# Altium footprint library Generic Footprint.PcbLib: 160 footprints (part 14 of 20) (continued)
## Symbol_FCC-Logo-1.5x1mm_silkscreen [mm] (continued)
1(0.534,0.466) 1(0.534,0.467) 1(0.534,0.469) 1(0.534,0.471) 1(0.534,0.605) 1(0.534,0.61) 1(0.534,0.612) 1(0.534,0.614) 1(0.534,0.615) 1(0.534,0.617) 1(0.534,0.619) 1(0.535,0.447) 1(0.535,0.449) 1(0.535,0.45) 1(0.535,0.452) 1(0.535,0.454) 1(0.535,0.455) 1(0.535,0.459) 1(0.535,0.461) 1(0.535,0.462) 1(0.535,0.464) 1(0.535,0.466) 1(0.535,0.467) 1(0.535,0.469) 1(0.535,0.605) 1(0.535,0.607) 1(0.535,0.61) 1(0.535,0.612) 1(0.535,0.614) 1(0.535,0.615) 1(0.535,0.617) 1(0.535,0.619) 1(0.535,0.622) 1(0.535,0.624) 1(0.535,0.626) 1(0.535,0.627) 1(0.535,0.629) 1(0.537,0.439) 1(0.537,0.44) 1(0.537,0.442) 1(0.537,0.444) 1(0.537,0.447) 1(0.537,0.449) 1(0.537,0.45) 1(0.537,0.452) 1(0.537,0.454) 1(0.537,0.455) 1(0.537,0.457) 1(0.537,0.459) 1(0.537,0.461) 1(0.537,0.462) 1(0.537,0.464) 1(0.537,0.466) 1(0.537,0.467) 1(0.537,0.469) 1(0.537,0.609) 1(0.537,0.61) 1(0.537,0.612) 1(0.537,0.614) 1(0.537,0.615) 1(0.537,0.617) 1(0.537,0.619) 1(0.537,0.62) 1(0.537,0.622) 1(0.537,0.624) 1(0.537,0.626) 1(0.537,0.627) 1(0.537,0.629) 1(0.537,0.632) 1(0.537,0.634) 1(0.537,0.636) 1(0.537,0.637) 1(0.537,0.639) 1(0.539,0.432) 1(0.539,0.435) 1(0.539,0.455) 1(0.539,0.622) 1(0.539,0.639) 1(0.539,0.641) 1(0.539,0.648) 1(0.541,0.422) 1(0.541,0.423) 1(0.541,0.425) 1(0.541,0.427) 1(0.541,0.428) 1(0.541,0.43) 1(0.541,0.433) 1(0.541,0.439) 1(0.541,0.44) 1(0.541,0.442) 1(0.541,0.444) 1(0.541,0.445) 1(0.541,0.447) 1(0.541,0.449) 1(0.541,0.45) 1(0.541,0.452) 1(0.541,0.454) 1(0.541,0.624) 1(0.541,0.626) 1(0.541,0.627) 1(0.541,0.629) 1(0.541,0.631) 1(0.541,0.632) 1(0.541,0.634) 1(0.541,0.636) 1(0.541,0.637) 1(0.541,0.641) 1(0.541,0.643) 1(0.541,0.644) 1(0.541,0.646) 1(0.541,0.649) 1(0.541,0.651) 1(0.541,0.653) 1(0.541,0.654) 1(0.541,0.656) 1(0.542,0.415) 1(0.542,0.416) 1(0.542,0.418) 1(0.542,0.42) 1(0.542,0.43) 1(0.542,0.432) 1(0.542,0.433) 1(0.542,0.435) 1(0.542,0.437) 1(0.542,0.439) 1(0.542,0.44) 1(0.542,0.442) 1(0.542,0.444) 1(0.542,0.632) 1(0.542,0.634) 1(0.542,0.636) 1(0.542,0.637) 1(0.542,0.639) 1(0.542,0.641) 1(0.542,0.643) 1(0.542,0.644) 1(0.542,0.646) 1(0.542,0.648) 1(0.542,0.649) 1(0.542,0.658) 1(0.542,0.659) 1(0.542,0.661) 1(0.542,0.663) 1(0.544,0.406) 1(0.544,0.408) 1(0.544,0.41) 1(0.544,0.411) 1(0.544,0.413) 1(0.544,0.422) 1(0.544,0.427) 1(0.544,0.43) 1(0.544,0.432) 1(0.544,0.433) 1(0.544,0.435) 1(0.544,0.643) 1(0.544,0.644) 1(0.544,0.646) 1(0.544,0.648) 1(0.544,0.649) 1(0.544,0.653) 1(0.544,0.654) 1(0.544,0.656) 1(0.544,0.665) 1(0.544,0.666) 1(0.544,0.668) 1(0.544,0.67) 1(0.544,0.671) 1(0.546,0.422) 1(0.546,0.427) 1(0.546,0.653) 1(0.546,0.654) 1(0.546,0.656) 1(0.547,0.401) 1(0.547,0.403) 1(0.547,0.405) 1(0.547,0.673) 1(0.547,0.675) 1(0.547,0.677) 1(0.549,0.393) 1(0.549,0.394) 1(0.549,0.396) 1(0.549,0.398) 1(0.549,0.401) 1(0.549,0.403) 1(0.549,0.675) 1(0.549,0.677) 1(0.549,0.68) 1(0.549,0.682) 1(0.549,0.683) 1(0.549,0.685) 1(0.551,0.388) 1(0.551,0.389) 1(0.551,0.393) 1(0.551,0.394) 1(0.551,0.396) 1(0.551,0.398) 1(0.551,0.399) 1(0.551,0.401) 1(0.551,0.403) 1(0.551,0.675) 1(0.551,0.677) 1(0.551,0.68) 1(0.551,0.682) 1(0.551,0.683) 1(0.551,0.685) 1(0.551,0.688) 1(0.552,0.382) 1(0.552,0.384) 1(0.552,0.388) 1(0.552,0.389) 1(0.552,0.393) 1(0.552,0.394) 1(0.552,0.396) 1(0.552,0.398) 1(0.552,0.678) 1(0.552,0.68) 1(0.552,0.682) 1(0.552,0.683) 1(0.552,0.685) 1(0.552,0.688) 1(0.552,0.692) 1(0.552,0.694) 1(0.552,0.695) 1(0.554,0.376) 1(0.554,0.377) 1(0.554,0.379) 1(0.554,0.382) 1(0.554,0.384) 1(0.554,0.388) 1(0.554,0.389) 1(0.554,0.391) 1(0.554,0.687) 1(0.554,0.688) 1(0.554,0.69) 1(0.554,0.692) 1(0.554,0.694) 1(0.554,0.695) 1(0.554,0.699) 1(0.554,0.7) 1(0.556,0.372) 1(0.556,0.374) 1(0.556,0.386) 1(0.556,0.692) 1(0.556,0.697) 1(0.556,0.7) 1(0.556,0.702) 1(0.556,0.704) 1(0.556,0.705) 1(0.558,0.365) 1(0.558,0.367) 1(0.558,0.369) 1(0.558,0.371) 1(0.558,0.376) 1(0.558,0.377) 1(0.558,0.381) 1(0.558,0.382) 1(0.558,0.384) 1(0.558,0.694) 1(0.558,0.695) 1(0.558,0.699) 1(0.558,0.707) 1(0.558,0.709) 1(0.558,0.711) 1(0.558,0.712) 1(0.558,1.078) 1(0.559,0.359) 1(0.559,0.36) 1(0.559,0.362) 1(0.559,0.364) 1(0.559,0.371) 1(0.559,0.372) 1(0.559,0.376) 1(0.559,0.377) 1(0.559,0.699) 1(0.559,0.7) 1(0.559,0.704) 1(0.559,0.705) 1(0.559,0.707) 1(0.559,0.714) 1(0.559,0.716) 1(0.559,0.717) 1(0.559,1.074) 1(0.559,1.076) 1(0.559,1.078) 1(0.561,0.357) 1(0.561,0.359) 1(0.561,0.36) 1(0.561,0.371) 1(0.561,0.372) 1(0.561,0.704) 1(0.561,0.705) 1(0.561,0.707) 1(0.561,0.717) 1(0.561,0.719) 1(0.561,0.721) 1(0.561,0.906) 1(0.561,0.908) 1(0.561,0.909) 1(0.561,0.911) 1(0.561,0.913) 1(0.561,0.915) 1(0.561,0.916) 1(0.561,0.918) 1(0.561,0.92) 1(0.561,0.921) 1(0.561,0.923) 1(0.561,0.925) 1(0.561,0.926) 1(0.561,0.928) 1(0.561,0.93) 1(0.561,0.932) 1(0.561,0.933) 1(0.561,0.935) 1(0.561,0.937) 1(0.561,0.938) 1(0.561,0.94) 1(0.561,0.942) 1(0.561,0.943) 1(0.561,0.945) 1(0.561,0.947) 1(0.561,0.948) 1(0.561,0.95) 1(0.561,0.952) 1(0.561,0.954) 1(0.561,0.955) 1(0.561,0.957) 1(0.561,0.959) 1(0.561,0.96) 1(0.561,0.962) 1(0.561,0.964) 1(0.561,0.966) 1(0.561,0.967) 1(0.561,0.969) 1(0.561,0.971) 1(0.561,0.972) 1(0.561,0.974) 1(0.561,0.976) 1(0.561,0.977) 1(0.561,0.979) 1(0.561,0.981) 1(0.561,0.983) 1(0.561,0.984) 1(0.561,0.986) 1(0.561,0.988) 1(0.561,0.989) 1(0.561,0.991) 1(0.561,0.993) 1(0.561,0.994) 1(0.561,0.996) 1(0.561,0.998) 1(0.561,1) 1(0.561,1.001) 1(0.561,1.003) 1(0.561,1.005) 1(0.561,1.006) 1(0.561,1.008) 1(0.561,1.01) 1(0.561,1.011) 1(0.561,1.013) 1(0.561,1.015) 1(0.561,1.017) 1(0.561,1.018) 1(0.561,1.02) 1(0.561,1.022) 1(0.561,1.023) 1(0.561,1.025) 1(0.561,1.027) 1(0.561,1.028) 1(0.561,1.03) 1(0.561,1.032) 1(0.561,1.034) 1(0.561,1.035) 1(0.561,1.037) 1(0.561,1.039) 1(0.561,1.04) 1(0.561,1.042) 1(0.561,1.044) 1(0.561,1.045) 1(0.561,1.047) 1(0.561,1.049) 1(0.561,1.051) 1(0.561,1.052) 1(0.561,1.054) 1(0.561,1.056) 1(0.561,1.057) 1(0.561,1.059) 1(0.561,1.061) 1(0.561,1.062) 1(0.561,1.064) 1(0.561,1.066) 1(0.561,1.067) 1(0.561,1.069) 1(0.561,1.071) 1(0.561,1.073) 1(0.561,1.074) 1(0.561,1.076) 1(0.561,1.078) 1(0.561,1.079) 1(0.563,0.357) 1(0.563,0.359) 1(0.563,0.36) 1(0.563,0.717) 1(0.563,0.721) 1(0.563,0.726) 1(0.563,0.906) 1(0.563,0.908) 1(0.563,0.909) 1(0.563,0.911) 1(0.563,0.913) 1(0.563,0.915) 1(0.563,0.916) 1(0.563,0.918) 1(0.563,0.92) 1(0.563,0.921) 1(0.563,0.923) 1(0.563,0.925) 1(0.563,0.926) 1(0.563,0.928) 1(0.563,0.93) 1(0.563,0.932) 1(0.563,0.933) 1(0.563,0.935) 1(0.563,0.937) 1(0.563,0.938) 1(0.563,0.94) 1(0.563,0.942) 1(0.563,0.943) 1(0.563,0.945) 1(0.563,0.947) 1(0.563,0.948) 1(0.563,0.95) 1(0.563,0.952) 1(0.563,0.954) 1(0.563,0.955) 1(0.563,0.957) 1(0.563,0.959) 1(0.563,0.96) 1(0.563,0.962) 1(0.563,0.964) 1(0.563,0.966) 1(0.563,0.967) 1(0.563,0.969) 1(0.563,0.971) 1(0.563,0.972) 1(0.563,0.974) 1(0.563,0.976) 1(0.563,0.977) 1(0.563,0.979) 1(0.563,0.981) 1(0.563,0.983) 1(0.563,0.984) 1(0.563,0.986) 1(0.563,0.988) 1(0.563,0.989) 1(0.563,0.991) 1(0.563,0.993) 1(0.563,0.994) 1(0.563,0.996) 1(0.563,0.998) 1(0.563,1) 1(0.563,1.001) 1(0.563,1.003) 1(0.563,1.005) 1(0.563,1.006) 1(0.563,1.008) 1(0.563,1.01) 1(0.563,1.011) 1(0.563,1.013) 1(0.563,1.015) 1(0.563,1.017) 1(0.563,1.018) 1(0.563,1.02) 1(0.563,1.022) 1(0.563,1.023) 1(0.563,1.025) 1(0.563,1.027) 1(0.563,1.028) 1(0.563,1.03) 1(0.563,1.032) 1(0.563,1.034) 1(0.563,1.035) 1(0.563,1.037) 1(0.563,1.039) 1(0.563,1.04) 1(0.563,1.042) 1(0.563,1.044) 1(0.563,1.045) 1(0.563,1.047) 1(0.563,1.049) 1(0.563,1.051) 1(0.563,1.052) 1(0.563,1.054) 1(0.563,1.056) 1(0.563,1.057) 1(0.563,1.059) 1(0.563,1.061) 1(0.563,1.062) 1(0.563,1.064) 1(0.563,1.066) 1(0.563,1.067) 1(0.563,1.069) 1(0.563,1.071) 1(0.563,1.074) 1(0.563,1.076) 1(0.564,0.35) 1(0.564,0.352) 1(0.564,0.354) 1(0.564,0.724) 1(0.564,0.728) 1(0.564,0.906) 1(0.564,0.908) 1(0.564,0.909) 1(0.564,0.911) 1(0.564,0.913) 1(0.564,0.915) 1(0.564,0.916) 1(0.564,0.918) 1(0.564,0.92) 1(0.564,0.921) 1(0.564,0.923) 1(0.564,0.925) 1(0.564,0.926) 1(0.564,0.928) 1(0.564,0.93) 1(0.564,0.932) 1(0.564,0.933) 1(0.564,0.935) 1(0.564,0.937) 1(0.564,0.938) 1(0.564,0.94) 1(0.564,0.942) 1(0.564,0.943) 1(0.564,0.945) 1(0.564,0.947) 1(0.564,0.948) 1(0.564,0.95) 1(0.564,0.952) 1(0.564,0.954) 1(0.564,0.955) 1(0.564,0.957) 1(0.564,0.959) 1(0.564,0.96) 1(0.564,0.962) 1(0.564,0.964) 1(0.564,0.966) 1(0.564,0.967) 1(0.564,0.969) 1(0.564,0.971) 1(0.564,0.972) 1(0.564,0.974) 1(0.564,0.976) 1(0.564,0.977) 1(0.564,0.979) 1(0.564,0.981) 1(0.564,0.983) 1(0.564,0.984) 1(0.564,0.986) 1(0.564,0.988) 1(0.564,0.989) 1(0.564,0.991) 1(0.564,0.993) 1(0.564,0.994) 1(0.564,0.996) 1(0.564,0.998) 1(0.564,1) 1(0.564,1.001) 1(0.564,1.003) 1(0.564,1.005) 1(0.564,1.006) 1(0.564,1.008) 1(0.564,1.01) 1(0.564,1.011) 1(0.564,1.013) 1(0.564,1.015) 1(0.564,1.017) 1(0.564,1.018) 1(0.564,1.02) 1(0.564,1.022) 1(0.564,1.023) 1(0.564,1.025) 1(0.564,1.027) 1(0.564,1.028) 1(0.564,1.03) 1(0.564,1.032) 1(0.564,1.034) 1(0.564,1.035) 1(0.564,1.037) 1(0.564,1.039) 1(0.564,1.04) 1(0.564,1.042) 1(0.564,1.044) 1(0.564,1.045) 1(0.564,1.047) 1(0.564,1.049) 1(0.564,1.051) 1(0.564,1.052) 1(0.564,1.054) 1(0.564,1.056) 1(0.564,1.057) 1(0.564,1.059) 1(0.564,1.061) 1(0.564,1.062) 1(0.564,1.064) 1(0.564,1.066) 1(0.564,1.067) 1(0.564,1.069) 1(0.566,0.347) 1(0.566,0.35) 1(0.566,0.352) 1(0.566,0.354) 1(0.566,0.355) 1(0.566,0.357) 1(0.566,0.721) 1(0.566,0.722) 1(0.566,0.724) 1(0.566,0.726) 1(0.566,0.728) 1(0.566,0.731) 1(0.566,0.903) 1(0.566,0.904) 1(0.566,1.071) 1(0.568,0.338) 1(0.568,0.342) 1(0.568,0.343) 1(0.568,0.347) 1(0.568,0.35) 1(0.568,0.352) 1(0.568,0.354) 1(0.568,0.724) 1(0.568,0.726) 1(0.568,0.728) 1(0.568,0.731) 1(0.568,0.734) 1(0.568,0.736) 1(0.568,0.903) 1(0.569,0.335) 1(0.569,0.342) 1(0.569,0.343) 1(0.569,0.347) 1(0.569,0.348) 1(0.569,0.729) 1(0.569,0.731) 1(0.569,0.734) 1(0.569,0.736) 1(0.569,0.739) 1(0.569,0.744) 1(0.569,0.901) 1(0.571,0.333) 1(0.571,0.338) 1(0.571,0.34) 1(0.571,0.342) 1(0.571,0.343) 1(0.571,0.345) 1(0.571,0.733) 1(0.571,0.734) 1(0.571,0.736) 1(0.571,0.738) 1(0.571,0.739) 1(0.571,0.743) 1(0.571,0.748) 1(0.573,0.328) 1(0.573,0.33) 1(0.573,0.331) 1(0.573,0.746) 1(0.574,0.325) 1(0.574,0.326) 1(0.574,0.336) 1(0.574,0.338) 1(0.574,0.739) 1(0.574,0.741) 1(0.574,0.75) 1(0.574,0.751) 1(0.574,0.753) 1(0.576,0.321) 1(0.576,0.323) 1(0.576,0.325) 1(0.576,0.753) 1(0.576,0.755) 1(0.576,0.756) 1(0.578,0.316) 1(0.578,0.318) 1(0.578,0.321) 1(0.578,0.323) 1(0.578,0.325) 1(0.578,0.753) 1(0.578,0.755) 1(0.578,0.756) 1(0.578,0.76) 1(0.58,0.314) 1(0.58,0.316) 1(0.58,0.318) 1(0.58,0.32) 1(0.58,0.321) 1(0.58,0.323) 1(0.58,0.755) 1(0.58,0.756) 1(0.58,0.76) 1(0.58,0.763) 1(0.581,0.758) 1(0.583,0.306) 1(0.583,0.309) 1(0.583,0.314) 1(0.583,0.316) 1(0.583,0.318) 1(0.583,0.76) 1(0.583,0.762) 1(0.583,0.763) 1(0.583,0.767) 1(0.583,0.768) 1(0.585,0.303) 1(0.585,0.304) 1(0.585,0.309) 1(0.585,0.313) 1(0.585,0.314) 1(0.585,0.763) 1(0.585,0.765) 1(0.585,0.767) 1(0.585,0.768) 1(0.585,0.772) 1(0.585,0.773) 1(0.586,0.299) 1(0.586,0.301) 1(0.586,0.304) 1(0.586,0.306) 1(0.586,0.309) 1(0.586,0.311) 1(0.586,0.767) 1(0.586,0.768) 1(0.586,0.772) 1(0.586,0.773) 1(0.586,0.775) 1(0.586,0.777) 1(0.586,0.779) 1(0.588,0.296) 1(0.588,0.304) 1(0.588,0.306) 1(0.588,0.308) 1(0.588,0.77) 1(0.588,0.772) 1(0.588,0.773) 1(0.588,0.782) 1(0.59,0.297) 1(0.59,0.78) 1(0.592,0.291) 1(0.592,0.292) 1(0.592,0.294) 1(0.592,0.784) 1(0.592,0.785) 1(0.592,0.787) 1(0.593,0.289) 1(0.593,0.291) 1(0.593,0.292) 1(0.593,0.784) 1(0.593,0.785) 1(0.593,0.789) 1(0.595,0.286) 1(0.595,0.289) 1(0.595,0.291) 1(0.595,0.292) 1(0.595,0.784) 1(0.595,0.785) 1(0.595,0.789) 1(0.597,0.282) 1(0.597,0.286) 1(0.597,0.289) 1(0.597,0.789) 1(0.597,0.796) 1(0.598,0.277) 1(0.598,0.279) 1(0.598,0.284) 1(0.598,0.794) 1(0.598,0.797) 1(0.598,0.799) 1(0.6,0.28) 1(0.6,0.282) 1(0.6,0.286) 1(0.6,0.287) 1(0.6,0.79) 1(0.6,0.792) 1(0.6,0.796) 1(0.6,0.801) 1(0.602,0.272) 1(0.602,0.274) 1(0.602,0.275) 1(0.602,0.277) 1(0.602,0.279) 1(0.602,0.282) 1(0.602,0.796) 1(0.602,0.797) 1(0.602,0.799) 1(0.602,0.801) 1(0.602,0.802) 1(0.602,0.804) 1(0.603,0.27) 1(0.603,0.277) 1(0.603,0.279) 1(0.603,0.797) 1(0.603,0.799) 1(0.603,0.801) 1(0.603,0.806) 1(0.603,0.807) 1(0.605,0.269) 1(0.605,0.27) 1(0.605,0.807) 1(0.605,0.809) 1(0.607,0.27) 1(0.608,0.262) 1(0.608,0.263) 1(0.608,0.265) 1(0.608,0.269) 1(0.608,0.807) 1(0.608,0.813) 1(0.608,0.814) 1(0.61,0.262) 1(0.61,0.263) 1(0.61,0.265) 1(0.61,0.267) 1(0.61,0.269) 1(0.61,0.811) 1(0.61,0.813) 1(0.61,0.814) 1(0.61,0.816) 1(0.612,0.257) 1(0.612,0.258) 1(0.612,0.263) 1(0.612,0.265) 1(0.612,0.813) 1(0.612,0.814) 1(0.612,0.816) 1(0.612,0.819) 1(0.612,0.821) 1(0.614,0.258) 1(0.614,0.26) 1(0.614,0.262) 1(0.614,0.816) 1(0.614,0.819) 1(0.615,0.251) 1(0.615,0.253) 1(0.615,0.255) 1(0.615,0.258) 1(0.615,0.818) 1(0.615,0.821) 1(0.615,0.823) 1(0.615,0.824) 1(0.615,0.826) 1(0.617,0.253) 1(0.617,0.819) 1(0.617,0.821) 1(0.617,0.824) 1(0.619,0.246) 1(0.619,0.248) 1(0.619,0.25) 1(0.619,0.253) 1(0.619,0.824) 1(0.619,0.828) 1(0.619,0.83) 1(0.619,0.831) 1(0.62,0.245) 1(0.62,0.83) 1(0.62,0.833) 1(0.622,0.243) 1(0.622,0.83) 1(0.622,0.833) 1(0.624,0.833) 1(0.624,0.835) 1(0.624,0.836) 1(0.624,0.838) 1(0.626,0.238) 1(0.626,0.24) 1(0.626,0.835) 1(0.626,0.836) 1(0.626,0.84) 1(0.627,0.235) 1(0.627,0.238) 1(0.627,0.24) 1(0.627,0.835) 1(0.627,0.836) 1(0.627,0.838) 1(0.629,0.231) 1(0.629,0.233) 1(0.629,0.24) 1(0.629,0.241) 1(0.629,0.838) 1(0.629,0.84) 1(0.629,0.843) 1(0.629,0.845) 1(0.631,0.229) 1(0.631,0.233) 1(0.631,0.235) 1(0.631,0.236) 1(0.631,0.238) 1(0.631,0.84) 1(0.631,0.841) 1(0.631,0.843) 1(0.631,0.847) 1(0.632,0.235) 1(0.632,0.843) 1(0.632,0.845) 1(0.632,0.848) 1(0.634,0.226) 1(0.634,0.228) 1(0.634,0.233) 1(0.634,0.845) 1(0.634,0.85) 1(0.634,0.852) 1(0.636,0.224) 1(0.636,0.226) 1(0.636,0.228) 1(0.636,0.85) 1(0.636,0.853) 1(0.637,0.223) 1(0.637,0.224) 1(0.637,0.228) 1(0.637,0.85) 1(0.637,0.852) 1(0.637,0.853) 1(0.637,0.855) 1(0.639,0.221) 1(0.639,0.223) 1(0.639,0.226) 1(0.639,0.852) 1(0.639,0.853) 1(0.639,0.855) 1(0.639,0.857) 1(0.641,0.218) 1(0.641,0.221) 1(0.641,0.224) 1(0.641,0.86) 1(0.642,0.214) 1(0.642,0.216) 1(0.642,0.223) 1(0.642,0.855) 1(0.642,0.857) 1(0.642,0.862) 1(0.644,0.212) 1(0.644,0.216) 1(0.644,0.218) 1(0.644,0.219) 1(0.644,0.221) 1(0.644,0.857) 1(0.644,0.86) 1(0.644,0.862) 1(0.644,0.863) 1(0.646,0.211) 1(0.646,0.214) 1(0.646,0.216) 1(0.646,0.218) 1(0.646,0.858) 1(0.646,0.86) 1(0.646,0.863) 1(0.646,0.865) 1(0.648,0.212) 1(0.648,0.214) 1(0.648,0.862) 1(0.648,0.863) 1(0.648,0.869) 1(0.649,0.867) 1(0.649,0.87) 1(0.651,0.206) 1(0.651,0.207) 1(0.651,0.209) 1(0.651,0.212) 1(0.651,0.872) 1(0.653,0.204) 1(0.653,0.206) 1(0.653,0.207) 1(0.653,0.872) 1(0.653,0.874) 1(0.654,0.202) 1(0.654,0.204) 1(0.654,0.206) 1(0.654,0.207) 1(0.654,0.872) 1(0.654,0.874) 1(0.654,0.875) 1(0.656,0.201) 1(0.656,0.202) 1(0.656,0.204) 1(0.656,0.874) 1(0.656,0.875) 1(0.656,0.877) 1(0.658,0.197) 1(0.658,0.199) 1(0.658,0.201) 1(0.658,0.877) 1(0.658,0.879) 1(0.66,0.195) 1(0.66,0.201) 1(0.66,0.202) 1(0.66,0.524) 1(0.66,0.525) 1(0.66,0.527) 1(0.66,0.529) 1(0.66,0.53) 1(0.66,0.532) 1(0.66,0.534) 1(0.66,0.535) 1(0.66,0.537) 1(0.66,0.539) 1(0.66,0.54) 1(0.66,0.542) 1(0.66,0.544) 1(0.66,0.546) 1(0.66,0.547) 1(0.66,0.549) 1(0.66,0.551) 1(0.66,0.552) 1(0.66,0.554) 1(0.66,0.875) 1(0.66,0.881) 1(0.661,0.194) 1(0.661,0.197) 1(0.661,0.498) 1(0.661,0.5) 1(0.661,0.501) 1(0.661,0.503) 1(0.661,0.505) 1(0.661,0.507) 1(0.661,0.508) 1(0.661,0.51) 1(0.661,0.512) 1(0.661,0.513) 1(0.661,0.515) 1(0.661,0.517) 1(0.661,0.518) 1(0.661,0.52) 1(0.661,0.522) 1(0.661,0.525) 1(0.661,0.527) 1(0.661,0.529) 1(0.661,0.53) 1(0.661,0.532) 1(0.661,0.534) 1(0.661,0.535) 1(0.661,0.537) 1(0.661,0.539) 1(0.661,0.54) 1(0.661,0.542) 1(0.661,0.544) 1(0.661,0.546) 1(0.661,0.547) 1(0.661,0.549) 1(0.661,0.551) 1(0.661,0.552) 1(0.661,0.556) 1(0.661,0.558) 1(0.661,0.559) 1(0.661,0.561) 1(0.661,0.563) 1(0.661,0.564) 1(0.661,0.566) 1(0.661,0.568) 1(0.661,0.569) 1(0.661,0.571) 1(0.661,0.573) 1(0.661,0.575) 1(0.661,0.576) 1(0.661,0.578) 1(0.661,0.58) 1(0.661,0.877) 1(0.661,0.881) 1(0.661,0.882) 1(0.661,0.884) 1(0.663,0.195) 1(0.663,0.197) 1(0.663,0.484) 1(0.663,0.486) 1(0.663,0.488) 1(0.663,0.49) 1(0.663,0.491) 1(0.663,0.493) 1(0.663,0.495) 1(0.663,0.498) 1(0.663,0.5) 1(0.663,0.501) 1(0.663,0.503) 1(0.663,0.505) 1(0.663,0.507) 1(0.663,0.508) 1(0.663,0.51) 1(0.663,0.512) 1(0.663,0.513) 1(0.663,0.515) 1(0.663,0.517) 1(0.663,0.518) 1(0.663,0.52) 1(0.663,0.525) 1(0.663,0.527) 1(0.663,0.529) 1(0.663,0.53) 1(0.663,0.532) 1(0.663,0.534) 1(0.663,0.535) 1(0.663,0.537) 1(0.663,0.539) 1(0.663,0.54) 1(0.663,0.542) 1(0.663,0.544) 1(0.663,0.546) 1(0.663,0.547) 1(0.663,0.549) 1(0.663,0.551) 1(0.663,0.552) 1(0.663,0.558) 1(0.663,0.559) 1(0.663,0.561) 1(0.663,0.563) 1(0.663,0.564) 1(0.663,0.566) 1(0.663,0.568) 1(0.663,0.569) 1(0.663,0.571) 1(0.663,0.573) 1(0.663,0.575) 1(0.663,0.576) 1(0.663,0.578) 1(0.663,0.58) 1(0.663,0.581) 1(0.663,0.583) 1(0.663,0.585) 1(0.663,0.586) 1(0.663,0.588) 1(0.663,0.59) 1(0.663,0.592) 1(0.663,0.593) 1(0.663,0.595) 1(0.663,0.881) 1(0.663,0.884) 1(0.663,0.886) 1(0.665,0.19) 1(0.665,0.195) 1(0.665,0.473) 1(0.665,0.474) 1(0.665,0.476) 1(0.665,0.478) 1(0.665,0.479) 1(0.665,0.481) 1(0.665,0.484) 1(0.665,0.486) 1(0.665,0.488) 1(0.665,0.49) 1(0.665,0.491) 1(0.665,0.493) 1(0.665,0.495) 1(0.665,0.496) 1(0.665,0.498) 1(0.665,0.5) 1(0.665,0.501) 1(0.665,0.503) 1(0.665,0.505) 1(0.665,0.507) 1(0.665,0.508) 1(0.665,0.51) 1(0.665,0.512) 1(0.665,0.513) 1(0.665,0.515) 1(0.665,0.517) 1(0.665,0.518) 1(0.665,0.52) 1(0.665,0.558) 1(0.665,0.559) 1(0.665,0.561) 1(0.665,0.563) 1(0.665,0.564) 1(0.665,0.566) 1(0.665,0.568) 1(0.665,0.569) 1(0.665,0.571) 1(0.665,0.573) 1(0.665,0.575) 1(0.665,0.576) 1(0.665,0.578) 1(0.665,0.58) 1(0.665,0.583) 1(0.665,0.585) 1(0.665,0.586) 1(0.665,0.588) 1(0.665,0.59) 1(0.665,0.592) 1(0.665,0.593) 1(0.665,0.595) 1(0.665,0.598) 1(0.665,0.6) 1(0.665,0.602) 1(0.665,0.603) 1(0.665,0.605) 1(0.665,0.884) 1(0.665,0.887) 1(0.665,0.889) 1(0.666,0.187) 1(0.666,0.189) 1(0.666,0.192) 1(0.666,0.483) 1(0.666,0.484) 1(0.666,0.486) 1(0.666,0.488) 1(0.666,0.49) 1(0.666,0.491) 1(0.666,0.493) 1(0.666,0.495) 1(0.666,0.585) 1(0.666,0.586) 1(0.666,0.588) 1(0.666,0.59) 1(0.666,0.592) 1(0.666,0.593) 1(0.666,0.595) 1(0.666,0.597) 1(0.668,0.185) 1(0.668,0.189) 1(0.668,0.464) 1(0.668,0.469) 1(0.668,0.473) 1(0.668,0.474) 1(0.668,0.476) 1(0.668,0.478) 1(0.668,0.479) 1(0.668,0.481) 1(0.668,0.583) 1(0.668,0.597) 1(0.668,0.598) 1(0.668,0.6) 1(0.668,0.602) 1(0.668,0.603) 1(0.668,0.605) 1(0.668,0.609) 1(0.668,0.614) 1(0.668,0.891) 1(0.67,0.187) 1(0.67,0.189) 1(0.67,0.449) 1(0.67,0.45) 1(0.67,0.452) 1(0.67,0.464) 1(0.67,0.471) 1(0.67,0.473) 1(0.67,0.474) 1(0.67,0.476) 1(0.67,0.478) 1(0.67,0.479) 1(0.67,0.481) 1(0.67,0.597) 1(0.67,0.598) 1(0.67,0.6) 1(0.67,0.602) 1(0.67,0.603) 1(0.67,0.605) 1(0.67,0.607) 1(0.67,0.609) 1(0.67,0.614) 1(0.67,0.626) 1(0.67,0.631) 1(0.67,0.891) 1(0.67,0.892) 1(0.671,0.184) 1(0.671,0.185) 1(0.671,0.187) 1(0.671,0.44) 1(0.671,0.442) 1(0.671,0.445) 1(0.671,0.449) 1(0.671,0.45) 1(0.671,0.452) 1(0.671,0.461) 1(0.671,0.462) 1(0.671,0.464) 1(0.671,0.466) 1(0.671,0.467) 1(0.671,0.609) 1(0.671,0.61) 1(0.671,0.612) 1(0.671,0.614) 1(0.671,0.615) 1(0.671,0.617) 1(0.671,0.626) 1(0.671,0.631) 1(0.671,0.634) 1(0.671,0.636) 1(0.671,0.637) 1(0.671,0.891) 1(0.671,0.892) 1(0.671,0.894) 1(0.673,0.18) 1(0.673,0.182) 1(0.673,0.184) 1(0.673,0.185) 1(0.673,0.432) 1(0.673,0.433) 1(0.673,0.435) 1(0.673,0.437) 1(0.673,0.44) 1(0.673,0.442) 1(0.673,0.445) 1(0.673,0.452) 1(0.673,0.454) 1(0.673,0.455) 1(0.673,0.457) 1(0.673,0.459) 1(0.673,0.619) 1(0.673,0.62) 1(0.673,0.622) 1(0.673,0.624) 1(0.673,0.634) 1(0.673,0.636) 1(0.673,0.637) 1(0.673,0.641) 1(0.673,0.643) 1(0.673,0.894) 1(0.673,0.896) 1(0.673,0.898) 1(0.675,0.178) 1(0.675,0.182) 1(0.675,0.184) 1(0.675,0.432) 1(0.675,0.445) 1(0.675,0.447) 1(0.675,0.449) 1(0.675,0.45) 1(0.675,0.626) 1(0.675,0.627) 1(0.675,0.629) 1(0.675,0.631) 1(0.675,0.632) 1(0.675,0.634) 1(0.675,0.639) 1(0.675,0.644) 1(0.675,0.646) 1(0.675,0.892) 1(0.675,0.896) 1(0.677,0.177) 1(0.677,0.18) 1(0.677,0.182) 1(0.677,0.425) 1(0.677,0.427) 1(0.677,0.428) 1(0.677,0.43) 1(0.677,0.432) 1(0.677,0.433) 1(0.677,0.435) 1(0.677,0.437) 1(0.677,0.439) 1(0.677,0.44) 1(0.677,0.442) 1(0.677,0.444) 1(0.677,0.636) 1(0.677,0.637) 1(0.677,0.639) 1(0.677,0.641) 1(0.677,0.643) 